# Altium footprint library LimeMicroAltiumLib.PcbLib: 760 footprints (part 40 of 50)
Each footprint in its own frame and in the unit in brackets; x right, y up, seen from the top. Pads: shape width x height; smd on the part's side, far side on the other; paste and mask are expansions set on the pad; w line width, h text height; cw(c..) or ccw(c..) is an arc to the next point about the centre after c.
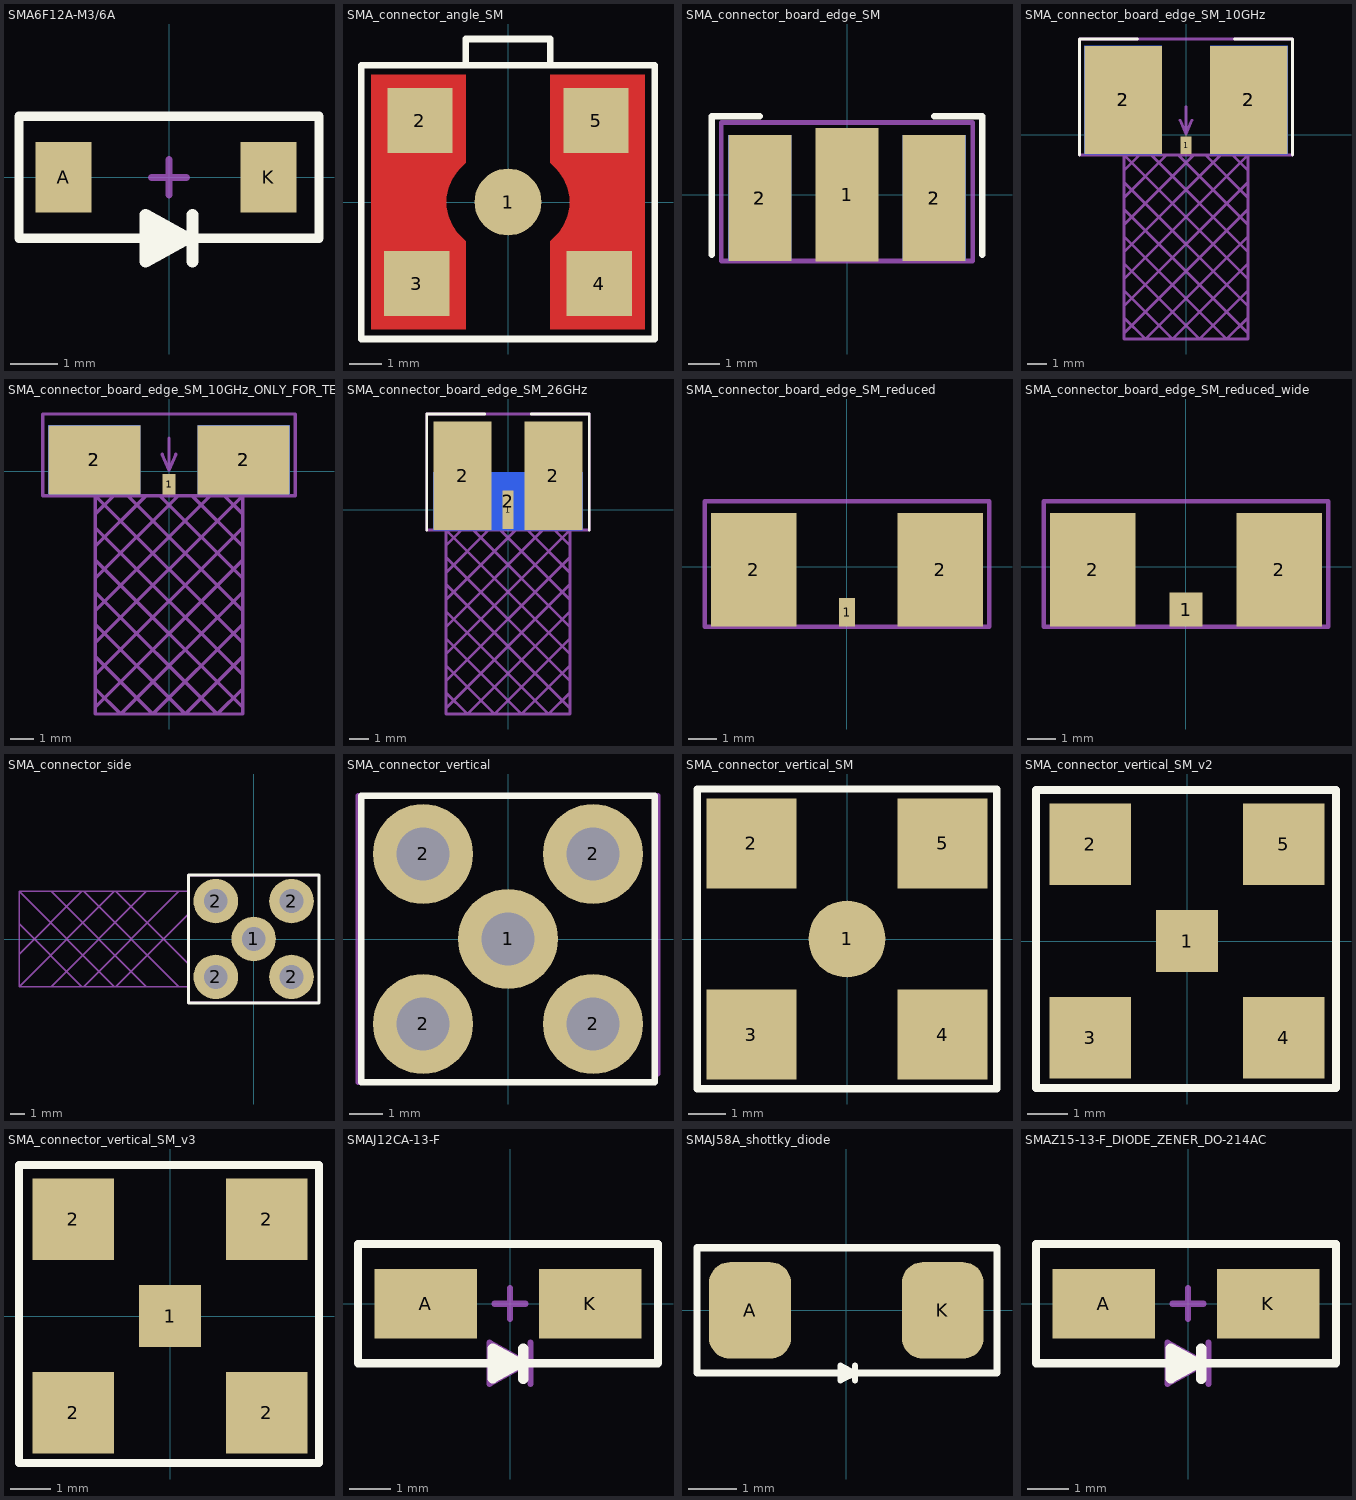
[diagram p39: the footprints below, top view; thin cyan lines are the x and y axes]

## SMA6F12A-M3/6A [mm]
pads (2):
  rect 1.2x1.5 smd: A(-2.25,0) K(2.125,0)
Top Overlay:
  lines w0.2: -3.2,-1.3 -3.2,1.3 3.2,1.3 3.2,-1.3 -3.2,-1.3
  lines w0.254: -0.5,-1.5 -0.1,-1.5 ; -0.5,-1.3 -0.3,-1.3 0.4,-1.3 ; -0.5,-1.1 0,-1.1 ; 0.5,-1.8 0.5,-0.8 ; 0.4,-1.3 -0.5,-1.8 -0.5,-0.8 0.4,-1.3
Mechanical 15:
  lines w0.15: -0.5,-1.3 -0.3,-1.3 0.4,-1.3 ; -0.375,0 0,0 ; 0,-0.375 0,0 ; 0,0.375 0,0 ; 0.375,0 0,0 ; 0.5,-1.8 0.5,-0.8 ; 0.4,-1.3 -0.5,-0.8 -0.5,-1.8 0.4,-1.3 ; -3.2,-1.3 3.2,-1.3 3.2,1.3 -3.2,1.3 -3.2,-1.3
  text ".Designator" at 0,0 h0.55
  text "C" at 2.15,-0.3 h0.55
  text "A" at -2.375,-0.3 h0.55

## SMA_connector_angle_SM [mm]
pads (5):
  round 2.05 smd: 1(0,0)
  rect 2x2 smd: 2(-2.7,2.5) 3(-2.8,-2.5) 4(2.8,-2.5) 5(2.7,2.5)
Top Layer:
  region: -1.3,-3.9 -4.2,-3.9 -4.2,3.9 -1.3,3.9 -1.3,1.2 -1.476,1.024 -1.571,0.919 -1.729,0.683 -1.838,0.42 -1.893,0.142 -1.9,0 -1.893,-0.142 -1.838,-0.42 -1.729,-0.683 -1.571,-0.919 -1.476,-1.024 -1.3,-1.2
  region: 1.3,-3.9 4.2,-3.9 4.2,3.9 1.3,3.9 1.3,1.2 1.476,1.024 1.571,0.919 1.729,0.683 1.838,0.42 1.893,0.142 1.9,0 1.893,-0.142 1.838,-0.42 1.729,-0.683 1.571,-0.919 1.476,-1.024 1.3,-1.2
Top Overlay:
  lines w0.2: -1.3,4.2 -1.3,5 1.3,5 1.3,4.2 ; -4.5,-4.2 4.5,-4.2 4.5,4.2 -4.5,4.2 -4.5,-4.2
Mechanical 15:
  lines w0.15: -1.3,4.2 -1.3,5 1.3,5 1.3,4.2 ; -0.5,0 0,0 ; 0,-0.5 0,0 ; 0,0.5 0,0 ; 0.5,0 0,0 ; -4.5,-4.2 4.5,-4.2 4.5,4.2 -4.5,4.2 -4.5,-4.2
  text ".Designator" at 0,0 h0.55
3D body "User Library-Con, 142-0711-201.STEP": height 8.84, standoff 0, extent -3.233,-3.233 3.234,3.234

## SMA_connector_board_edge_SM [mm]
pads (5):
  rect 2x4.25 smd: 1(0,0)
  rect 2x4 smd: 2(-2.77,-0.1) 2(2.77,-0.1)
  rect 2x4 smd far side: 2(-2.77,-0.1) 2(2.77,-0.1)
Top Overlay:
  lines w0.2: -4.3,-1.9 -4.3,2.5 -2.775,2.5 ; 2.775,2.5 4.3,2.5 4.3,-1.9
Mechanical 15:
  lines w0.15: -4,-2.1 -4,2.3 4,2.3 4,-2.1 -4,-2.1
  text "PCB edge" at -2.2,-2.1 h0.55
  text ".Designator" at 0,0 h0.55
3D body "User Library-620-SMA-02-112-TGG SMA Female for PCB edge Mount.step": height 3.4, standoff -2.65, extent -3,-11.8 3,1.8

## SMA_connector_board_edge_SM_10GHz [mm]
pads (5):
  rect 0.55x0.9 smd mask+0.05: 1(0,-0.55)
  rect 4x5.6 smd mask+0.05: 2(-3.25,1.8) 2(3.25,1.8)
  rect 4x5.6 smd far side mask+0.05: 2(-3.25,1.8) 2(3.25,1.8)
Top Overlay:
  lines w0.15: -5.5,-1.05 -5.5,4.95 -2.5,4.95 ; 2.5,4.95 5.5,4.95 5.5,-1.05
Mechanical 1:
  lines w0.15: -3.2,-10.25 3.2,-3.85 ; -3.2,-9.45 -2.1,-10.55 3.2,-5.25 ; -3.2,-8.85 3.2,-2.45 ; -3.2,-8.05 -0.7,-10.55 3.2,-6.65 ; -3.2,-7.45 3.2,-1.05 ; -3.2,-6.65 0.7,-10.55 3.2,-8.05 ; -3.2,-6.05 1.8,-1.05 ; -3.2,-5.25 2.1,-10.55 3.2,-9.45 ; -3.2,-4.65 0.4,-1.05 ; -3.2,-3.85 3.2,-10.25 ; -3.2,-3.25 -1,-1.05 ; -3.2,-2.45 3.2,-8.85 ; -3.2,-1.85 -2.4,-1.05 ; -1.8,-1.05 3.2,-6.05 ; -0.4,-1.05 3.2,-4.65 ; 1,-1.05 3.2,-3.25 ; 2.4,-1.05 3.2,-1.85 ; 3.2,-7.85 3.2,-7.45 -3.2,-1.05 ; -3.2,-1.05 3.2,-1.05 ; -3.2,-1.05 -3.2,-10.55 3.2,-10.55 3.2,-1.05
Mechanical 15:
  lines w0.15: -0.3,0.75 0,0.05 ; 0,1.45 0,0.05 ; 0.3,0.75 0,0.05 ; -5.5,-1.05 -5.5,4.95 5.5,4.95 5.5,-1.05 -5.5,-1.05
  text ".Designator" at 0,1.8 h0.55
  text "Board edge" at -2.8,-0.7 h0.55
3D body "142-0701-841.stp": height 3.96, standoff -3.96, extent -4.763,-10.475 4.763,3.8

## SMA_connector_board_edge_SM_10GHz_ONLY_FOR_TEST [mm]
pads (5):
  rect 0.55x0.9 smd mask+0.05: 1(0,-0.55)
  rect 4x3 smd mask+0.05: 2(-3.25,0.5) 2(3.25,0.5)
  rect 4x3 smd far side mask+0.05: 2(-3.25,0.5) 2(3.25,0.5)
Mechanical 1:
  lines w0.15: -3.2,-10.25 3.2,-3.85 ; -3.2,-9.45 -2.1,-10.55 3.2,-5.25 ; -3.2,-8.85 3.2,-2.45 ; -3.2,-8.05 -0.7,-10.55 3.2,-6.65 ; -3.2,-7.45 3.2,-1.05 ; -3.2,-6.65 0.7,-10.55 3.2,-8.05 ; -3.2,-6.05 1.8,-1.05 ; -3.2,-5.25 2.1,-10.55 3.2,-9.45 ; -3.2,-4.65 0.4,-1.05 ; -3.2,-3.85 3.2,-10.25 ; -3.2,-3.25 -1,-1.05 ; -3.2,-2.45 3.2,-8.85 ; -3.2,-1.85 -2.4,-1.05 ; -1.8,-1.05 3.2,-6.05 ; -0.4,-1.05 3.2,-4.65 ; 1,-1.05 3.2,-3.25 ; 2.4,-1.05 3.2,-1.85 ; 3.2,-7.85 3.2,-7.45 -3.2,-1.05 ; -3.2,-1.05 3.2,-1.05 ; -3.2,-1.05 -3.2,-10.55 3.2,-10.55 3.2,-1.05
Mechanical 15:
  lines w0.15: -0.3,0.75 0,0.05 ; 0,1.45 0,0.05 ; 0.3,0.75 0,0.05 ; -5.5,-1.05 -5.5,2.5 5.5,2.5 5.5,-1.05 -5.5,-1.05
  text ".Designator" at 0,1.8 h0.55
  text "Board edge" at -2.8,-0.7 h0.55
3D body "142-0701-841.stp": height 3.96, standoff -3.96, extent -4.763,-10.475 4.763,3.8

## SMA_connector_board_edge_SM_26GHz [mm]
pads (4):
  rect 0.55x2 smd mask+0.05: 1(0,0)
  rect 3x5.6 smd mask+0.05: 2(-2.35,1.75) 2(2.35,1.75)
  rect 7.7x3 smd far side mask+0.05: 2(0,0.45)
Top Overlay:
  lines w0.15: -4.2,-1.05 -4.2,4.95 -1.2,4.95 ; 1.2,4.95 4.2,4.95 4.2,-1.05
Mechanical 1:
  lines w0.15: -3.2,-10.25 3.2,-3.85 ; -3.2,-9.45 -2.1,-10.55 3.2,-5.25 ; -3.2,-8.85 3.2,-2.45 ; -3.2,-8.05 -0.7,-10.55 3.2,-6.65 ; -3.2,-7.45 3.2,-1.05 ; -3.2,-6.65 0.7,-10.55 3.2,-8.05 ; -3.2,-6.05 1.8,-1.05 ; -3.2,-5.25 2.1,-10.55 3.2,-9.45 ; -3.2,-4.65 0.4,-1.05 ; -3.2,-3.85 3.2,-10.25 ; -3.2,-3.25 -1,-1.05 ; -3.2,-2.45 3.2,-8.85 ; -3.2,-1.85 -2.4,-1.05 ; -1.8,-1.05 3.2,-6.05 ; -0.4,-1.05 3.2,-4.65 ; 1,-1.05 3.2,-3.25 ; 2.4,-1.05 3.2,-1.85 ; 3.2,-7.85 3.2,-7.45 -3.2,-1.05 ; -3.2,-1.05 3.2,-1.05 ; -3.2,-1.05 -3.2,-10.55 3.2,-10.55 3.2,-1.05
Mechanical 15:
  lines w0.15: -0.3,0.75 0,0.05 ; 0,1.45 0,0.05 ; 0.3,0.75 0,0.05 ; -4.2,-1.05 -4.2,4.95 4.2,4.95 4.2,-1.05 -4.2,-1.05
  text ".Designator" at 0,1.8 h0.55
  text "Board edge" at -2.8,-0.7 h0.55
3D body "142-0761-871.stp": height 3.47, standoff -2.88, extent -3.175,-10.525 3.175,3.547

## SMA_connector_board_edge_SM_reduced [mm]
pads (3):
  rect 0.55x1 smd: 1(0,-1.6)
  rect 3x4 smd: 2(-3.27,-0.1) 2(3.27,-0.1)
Mechanical 15:
  lines w0.15: -5,-2.1 5,-2.1 5,2.3 -5,2.3 -5,-2.1
  text ".Designator" at 0,0 h0.55
  text "PCB edge" at -2.2,-2.1 h0.55
3D body "142-0701-841.stp": height 4.06, standoff -3.86, extent -4.762,-12.525 4.763,1.75

## SMA_connector_board_edge_SM_reduced_wide [mm]
pads (3):
  rect 1.15x1.2 smd: 1(0,-1.5)
  rect 3x4 smd: 2(-3.27,-0.1) 2(3.27,-0.1)
Mechanical 15:
  lines w0.15: -5,-2.1 5,-2.1 5,2.3 -5,2.3 -5,-2.1
  text ".Designator" at 0,0 h0.55
  text "PCB edge" at -2.2,-2.1 h0.55
3D body "142-0701-841.stp": height 4.06, standoff -3.86, extent -4.762,-12.525 4.763,1.75

## SMA_connector_side [mm]
pads (5):
  round 3 hole 1.6: 1(0,0) 2(-2.55,-2.55) 2(-2.55,2.55) 2(2.55,-2.55) 2(2.55,2.55)
Top Overlay:
  lines w0.2: -4.4,-4.3 -4.4,4.3 4.4,4.3 4.4,-4.3 -4.4,-4.3
Mechanical 15:
  lines w0.1: -15.8,-1.025 -11.575,3.2 ; -15.8,1.025 -11.575,-3.2 ; -13.625,-3.2 -7.225,3.2 ; -13.625,3.2 -7.225,-3.2 ; -11.45,-3.2 -5.05,3.2 ; -11.45,3.2 -5.05,-3.2 ; -9.4,-3.2 -15.8,3.2 ; -9.4,3.2 -15.8,-3.2 ; -9.275,-3.2 -4.4,1.675 ; -9.275,3.2 -4.4,-1.675 ; -4.4,-3.2 -15.8,-3.2 ; -4.4,3.2 -15.8,3.2 ; -15.8,-3.2 -15.8,3.2
  lines w0.15: -4.25,-4.3 4.25,-4.3 ; -0.5,0 0,0 ; 0,-0.5 0,0 ; 0,0.5 0,0 ; 0.5,0 0,0 ; -4.4,-4.3 -4.4,4.3 4.4,4.3 4.4,-4.3 -4.4,-4.3
  text "Connector out" at -1.7,-3.35 h0.8
  text ".Designator" at 0,0 h0.55
3D body "User Library-SMA-RIGHTANGLE-TE.step": height 9.6, standoff -3.9, extent -15.8,-3.2 3.2,3.2

## SMA_connector_vertical [mm]
pads (5):
  round 3 hole 1.6: 1(0,0) 2(-2.55,-2.55) 2(-2.55,2.55) 2(2.55,-2.55) 2(2.55,2.55)
Top Overlay:
  lines w0.2: -4.4,-4.3 -4.4,4.3 4.4,4.3 4.4,-4.3 -4.4,-4.3
Mechanical 15:
  lines w0.15: -4.25,-4.3 4.25,-4.3 -4.5,-4.3 -4.5,4.3 4.5,4.3 4.5,-4.05 4.5,4 ; -0.5,0 0,0 ; 0,-0.5 0,0 ; 0,0.5 0,0 ; 0.5,0 0,0
  text ".Designator" at 0,0 h0.55
3D body "User Library-SMA_Stehend_Amp 132134RP-1.STEP": height 9.53, standoff -3.94, extent -3.5,-3.5 3.5,3.5

## SMA_connector_vertical_SM [mm]
pads (5):
  round 2.05 smd: 1(0,0)
  rect 2.4x2.4 smd: 2(-2.55,2.55) 3(-2.55,-2.55) 4(2.55,-2.55) 5(2.55,2.55)
Top Overlay:
  lines w0.2: -4,-4 4,-4 4,4 -4,4 -4,-4
Mechanical 15:
  lines w0.15: -0.5,0 0,0 ; 0,-0.5 0,0 ; 0,0.5 0,0 ; 0.5,0 0,0 ; 4,3.95 4,-4 -4,-4 -4,4 ; -4,4 3.95,4 -4,4
  text ".Designator" at 0,0 h0.55
3D body "User Library-Con, 142-0711-201.STEP": height 8.84, standoff 0, extent -3.233,-3.233 3.234,3.234

## SMA_connector_vertical_SM_v2 [mm]
pads (5):
  rect 1.52x1.52 smd: 1(0,0)
  rect 2x2 smd: 2(-2.37,2.37) 3(-2.37,-2.37) 4(2.37,-2.37) 5(2.37,2.37)
Top Overlay:
  lines w0.2: -3.7,-3.6 3.65,-3.6 3.65,3.7 -3.7,3.7 -3.7,-3.6
Mechanical 15:
  lines w0.15: -0.5,0 0,0 ; 0,-0.5 0,0 ; 0,0.5 0,0 ; 0.5,0 0,0 ; -3.7,-3.6 -3.7,3.7 3.65,3.7 3.65,-3.6 -3.7,-3.6
  text ".Designator" at 0,0 h0.55
3D body "User Library-Con, 142-0711-201.STEP": height 8.84, standoff 0, extent -3.233,-3.233 3.234,3.234

## SMA_connector_vertical_SM_v3 [mm]
pads (5):
  rect 1.52x1.52 smd: 1(0,0)
  rect 2x2 smd: 2(-2.37,-2.37) 2(-2.37,2.37) 2(2.37,-2.37) 2(2.37,2.37)
Top Overlay:
  lines w0.2: -3.7,-3.6 -3.7,3.7 3.65,3.7 3.65,-3.6 -3.7,-3.6
Mechanical 15:
  lines w0.15: -0.5,0 0,0 ; 0,-0.5 0,0 ; 0,0.5 0,0 ; 0.5,0 0,0 ; -3.7,-3.6 3.65,-3.6 3.65,3.7 -3.7,3.7 -3.7,-3.6
  text ".Designator" at 0,0 h0.55
3D body "User Library-Con, 142-0711-201.STEP": height 8.84, standoff 0, extent -3.233,-3.233 3.234,3.234

## SMAJ12CA-13-F [mm]
pads (2):
  rect 2.5x1.7 smd: A(-2.05,0) K(1.95,0)
Top Overlay:
  lines w0.2: -3.7,-1.45 3.6,-1.45 3.6,1.45 -3.7,1.45 -3.7,-1.45
  lines w0.254: -0.475,-1.45 0.225,-1.45 ; -0.275,-1.55 -0.275,-1.35 ; 0.325,-1.825 0.325,-1.1 ; 0.225,-1.45 -0.425,-1.089 -0.425,-1.811 0.225,-1.45
Mechanical 15:
  lines w0.15: -0.5,-1.45 -0.3,-1.45 0.4,-1.45 ; -0.375,0 0,0 ; 0,-0.375 0,0 ; 0,0.375 0,0 ; 0.375,0 0,0 ; 0.5,-1.95 0.5,-0.95 ; 0.4,-1.45 -0.5,-1.95 -0.5,-0.95 0.4,-1.45 ; -3.7,-1.45 -3.7,1.45 3.6,1.45 3.6,-1.45 -3.7,-1.45
  text "A" at -2.375,-0.3 h0.55
  text "C" at 2.15,-0.3 h0.55
  text ".Designator" at 0,0 h0.55
3D body "User Library-Diode Molded Body.step": height 1.79, standoff -1.13, extent -2.65,-1.3 2.65,1.3

## SMAJ58A_shottky_diode [mm]
pads (2):
  rrect50% 1.7x2 smd mask+0.05: A(-2,0) K(2,0)
Top Overlay:
  lines w0.127: -0.125,-1.3 0.175,-1.3 ; 0.175,-1.45 0.175,-1.15 ; 0.175,-1.3 -0.125,-1.45 -0.125,-1.15 0.175,-1.3
  lines w0.15: -3.1,-1.3 3.125,-1.3 3.125,1.3 -3.1,1.3 -3.1,-1.3
Mechanical 15:
  text "A" at -2.4,-0.5 h0.55
  text ".Designator" at -0.1,-0.3 h0.55
3D body "User Library-Diode Molded Body.step": height 2.89, standoff -0.03, extent -2.65,-1.3 2.65,1.3

## SMAZ15-13-F_DIODE_ZENER_DO-214AC [mm]
pads (2):
  rect 2.5x1.7 smd: A(-2.05,0) K(1.95,0)
Top Overlay:
  lines w0.2: -3.7,-1.45 3.6,-1.45 3.6,1.45 -3.7,1.45 -3.7,-1.45
  lines w0.254: -0.475,-1.45 0.225,-1.45 ; -0.275,-1.55 -0.275,-1.35 ; 0.325,-1.825 0.325,-1.1 ; 0.225,-1.45 -0.425,-1.089 -0.425,-1.811 0.225,-1.45
Mechanical 15:
  lines w0.15: -0.5,-1.45 -0.3,-1.45 0.4,-1.45 ; -0.375,0 0,0 ; 0,-0.375 0,0 ; 0,0.375 0,0 ; 0.375,0 0,0 ; 0.5,-1.95 0.5,-0.95 ; 0.4,-1.45 -0.5,-1.95 -0.5,-0.95 0.4,-1.45 ; -3.7,-1.45 -3.7,1.45 3.6,1.45 3.6,-1.45 -3.7,-1.45
  text "A" at -2.375,-0.3 h0.55
  text "C" at 2.15,-0.3 h0.55
  text ".Designator" at 0,0 h0.55
3D body "User Library-Diode Molded Body.step": height 1.79, standoff -1.13, extent -2.65,-1.3 2.65,1.3